# Altium footprint library Amirreza.PcbLib: 524 footprints (part 7 of 33)
Each footprint in its own frame and in the unit in brackets; x right, y up, seen from the top. Pads: shape width x height; smd on the part's side, far side on the other; paste and mask are expansions set on the pad; w line width, h text height; cw(c..) or ccw(c..) is an arc to the next point about the centre after c.
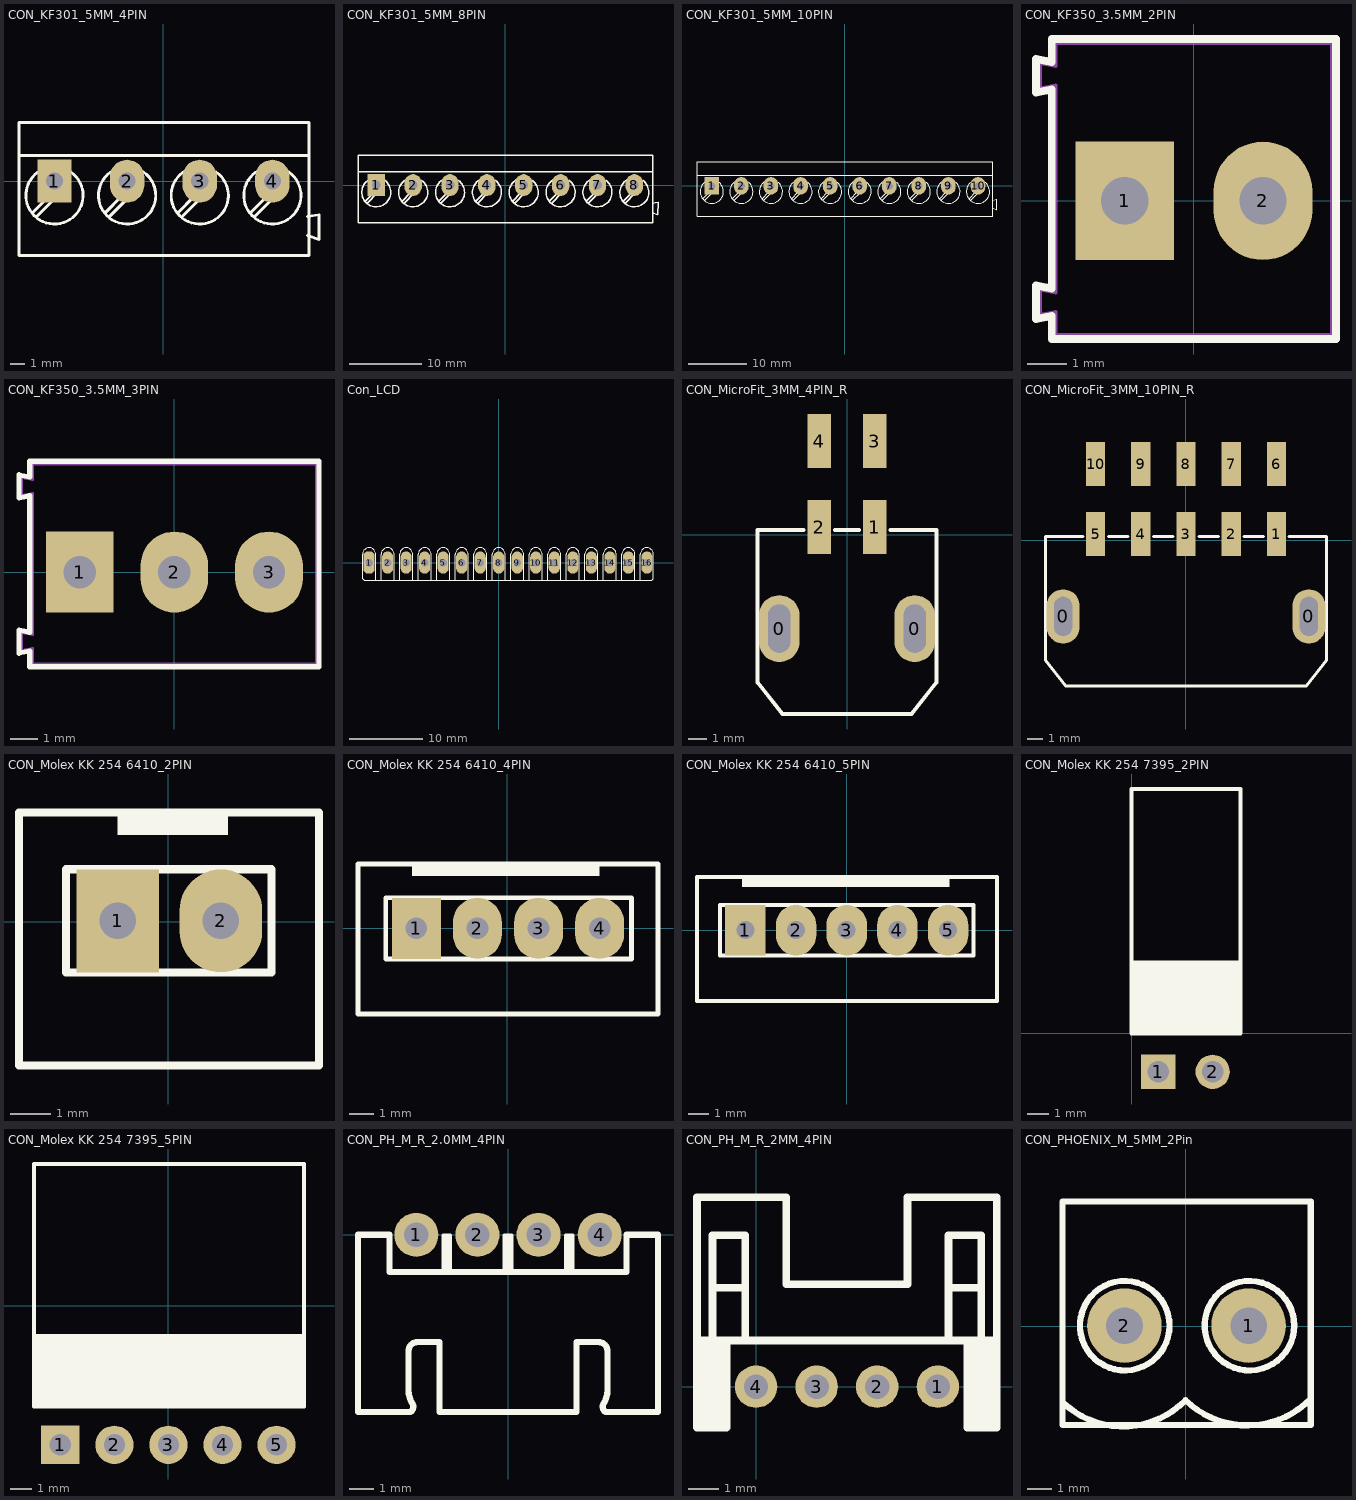
[diagram p6: the footprints below, top view; thin cyan lines are the x and y axes]

## CON_KF301_5MM_4PIN [mm] "Terminal Block Blue"
pads (4):
  rect 2.4x3 hole 1.2: 1(-7.62,0)
  oval 2.4x3 hole 1.2: 2(-2.54,0) 3(2.54,0) 4(7.62,0)
Top Overlay:
  lines w0.2: -10.1,1.8 10.18,1.8 ; -9.151,-2.209 -8.001,-1.059 ; -8.869,-2.491 -7.469,-1.091 ; -8.62,0.732 ccw(c-7.62,-1) -6.473,0.638 ; -4.071,-2.209 -2.921,-1.059 ; -3.789,-2.491 -2.389,-1.091 ; -3.54,0.732 ccw(c-2.54,-1) -1.393,0.638 ; 1.009,-2.209 2.159,-1.059 ; 1.291,-2.491 2.691,-1.091 ; 1.54,0.732 ccw(c2.54,-1) 3.687,0.638 ; 6.089,-2.209 7.239,-1.059 ; 6.371,-2.491 7.771,-1.091 ; 6.62,0.732 ccw(c7.62,-1) 8.767,0.638 ; 10.075,-2.484 10.88,-2.35 10.88,-4.075 10.084,-3.81 ; -10.1,-5.2 -10.1,4.1 10.18,4.1 10.18,-5.2 -10.1,-5.2
3D body "Socket Blue_4Pin.STEP": height 12.52, standoff -6.68, extent -10.031,-5.029 10.871,4.039

## CON_KF301_5MM_8PIN [mm] "Terminal Block Blue"
pads (8):
  rect 2.4x3 hole 1.2: 1(-17.78,0)
  oval 2.4x3 hole 1.2: 2(-12.7,0) 3(-7.62,0) 4(-2.54,0) 5(2.54,0) 6(7.62,0) 7(12.7,0) 8(17.78,0)
Top Overlay:
  lines w0.2: -20.3,1.8 20.34,1.8 ; -19.311,-2.209 -18.161,-1.059 ; -19.029,-2.491 -17.629,-1.091 ; -18.78,0.732 ccw(c-17.78,-1) -16.633,0.638 ; -14.231,-2.209 -13.081,-1.059 ; -13.949,-2.491 -12.549,-1.091 ; -13.7,0.732 ccw(c-12.7,-1) -11.553,0.638 ; -9.151,-2.209 -8.001,-1.059 ; -8.869,-2.491 -7.469,-1.091 ; -8.62,0.732 ccw(c-7.62,-1) -6.473,0.638 ; -4.071,-2.209 -2.921,-1.059 ; -3.789,-2.491 -2.389,-1.091 ; -3.54,0.732 ccw(c-2.54,-1) -1.393,0.638 ; 1.009,-2.209 2.159,-1.059 ; 1.291,-2.491 2.691,-1.091 ; 1.54,0.732 ccw(c2.54,-1) 3.687,0.638 ; 6.089,-2.209 7.239,-1.059 ; 6.371,-2.491 7.771,-1.091 ; 6.62,0.732 ccw(c7.62,-1) 8.767,0.638 ; 11.169,-2.209 12.319,-1.059 ; 11.451,-2.491 12.851,-1.091 ; 11.7,0.732 ccw(c12.7,-1) 13.847,0.638 ; 16.249,-2.209 17.399,-1.059 ; 16.531,-2.491 17.931,-1.091 ; 16.78,0.732 ccw(c17.78,-1) 18.927,0.638 ; 20.235,-2.484 21.04,-2.35 21.04,-4.075 20.244,-3.81 ; -20.3,-5.2 -20.3,4.1 20.34,4.1 20.34,-5.2 -20.3,-5.2
3D body "Socket Blue_8Pin.STEP": height 12.52, standoff -6.68, extent -20.216,-5.017 21.006,4.051

## CON_KF301_5MM_10PIN [mm] "Terminal Block Blue"
pads (10):
  rect 2.5x3 hole 1.2: 1(-22.86,0)
  oval 2.5x3 hole 1.2: 2(-17.78,0) 3(-12.7,0) 4(-7.62,0) 5(-2.54,0) 6(2.54,0) 7(7.62,0) 8(12.7,0) 9(17.78,0) 10(22.86,0)
Top Overlay:
  lines w0.2: -25.4,1.8 25.42,1.8 ; -24.391,-2.209 -23.241,-1.059 ; -24.109,-2.491 -22.709,-1.091 ; -23.86,0.732 ccw(c-22.86,-1) -21.713,0.638 ; -19.311,-2.209 -18.161,-1.059 ; -19.029,-2.491 -17.629,-1.091 ; -18.78,0.732 ccw(c-17.78,-1) -16.633,0.638 ; -14.231,-2.209 -13.081,-1.059 ; -13.949,-2.491 -12.549,-1.091 ; -13.7,0.732 ccw(c-12.7,-1) -11.553,0.638 ; -9.151,-2.209 -8.001,-1.059 ; -8.869,-2.491 -7.469,-1.091 ; -8.62,0.732 ccw(c-7.62,-1) -6.473,0.638 ; -4.071,-2.209 -2.921,-1.059 ; -3.789,-2.491 -2.389,-1.091 ; -3.54,0.732 ccw(c-2.54,-1) -1.393,0.638 ; 1.009,-2.209 2.159,-1.059 ; 1.291,-2.491 2.691,-1.091 ; 1.54,0.732 ccw(c2.54,-1) 3.687,0.638 ; 6.089,-2.209 7.239,-1.059 ; 6.371,-2.491 7.771,-1.091 ; 6.62,0.732 ccw(c7.62,-1) 8.767,0.638 ; 11.169,-2.209 12.319,-1.059 ; 11.451,-2.491 12.851,-1.091 ; 11.7,0.732 ccw(c12.7,-1) 13.847,0.638 ; 16.249,-2.209 17.399,-1.059 ; 16.531,-2.491 17.931,-1.091 ; 16.78,0.732 ccw(c17.78,-1) 18.927,0.638 ; 21.329,-2.209 22.479,-1.059 ; 21.611,-2.491 23.011,-1.091 ; 21.86,0.732 ccw(c22.86,-1) 24.007,0.638 ; 25.315,-2.484 26.12,-2.35 26.12,-4.075 25.324,-3.81 ; -25.4,-5.2 -25.4,4.1 25.42,4.1 25.42,-5.2 -25.4,-5.2
3D body "Socket Blue_10Pin.STEP": height 12.52, standoff -6.68, extent -25.298,-4.991 26.086,4.077

## CON_KF350_3.5MM_2PIN [mm]
pads (2):
  rect 2.5x3 hole 1.2: 1(-1.75,0)
  oval 2.5x3 hole 1.2: 2(1.75,0)
Top Overlay:
  lines w0.2: -4,-2.995 -3.6,-2.92 -3.6,-3.5 3.6,-3.5 3.6,4.1 -3.6,4.1 -3.6,3.52 -4,3.595 -4,2.745 -3.6,2.82 -3.6,-2.22 -4,-2.145 -4,-2.995
Mechanical 13:
  lines w0.1: -3.9,-2.895 -3.9,-2.245 -3.5,-2.32 -3.5,2.92 -3.9,2.845 -3.9,3.495 -3.5,3.42 -3.5,4 3.5,4 3.5,-3.4 -3.5,-3.4 -3.5,-2.82 -3.9,-2.895
3D body "691214110002.stp": height 8.55, standoff -3.65, extent -4.001,-3.37 3.449,4.03

## CON_KF350_3.5MM_3PIN [mm]
pads (3):
  rect 2.5x3 hole 1.2: 1(-3.5,0)
  oval 2.5x3 hole 1.2: 2(0,0) 3(3.5,0)
Top Overlay:
  lines w0.2: -5.75,-2.995 -5.35,-2.92 -5.35,-3.5 5.35,-3.5 5.35,4.1 -5.35,4.1 -5.35,3.52 -5.75,3.595 -5.75,2.745 -5.35,2.82 -5.35,-2.22 -5.75,-2.145 -5.75,-2.995
Mechanical 13:
  lines w0.1: -5.65,-2.895 -5.65,-2.245 -5.25,-2.32 -5.25,2.92 -5.65,2.845 -5.65,3.495 -5.25,3.42 -5.25,4 5.25,4 5.25,-3.4 -5.25,-3.4 -5.25,-2.82 -5.65,-2.895
3D body "691214110003.stp": height 8.55, standoff -3.65, extent -5.751,-3.395 5.199,4.005

## Con_LCD [mil]
pads (16):
  oct 60x120 hole 40: 1(-700,0)
  oval 60x120 hole 40: 2(-600,0) 3(-500,0) 4(-400,0) 5(-300,0) 6(-200,0) 7(-100,0) 8(0,0) 9(100,0) 10(200,0) 11(300,0) 12(400,0) 13(500,0) 14(600,0) 15(700,0) 16(800,0)
Top Overlay:
  lines w5: -735,-87.36 -735,45 cw(c-700,45) -665,45 -665,-95 ; -635,-95 -635,45 cw(c-600,45) -565,45 -565,-95 ; -535,-95 -535,45 cw(c-500,45) -465,45 -465,-95 ; -435,-95 -435,45 cw(c-400,45) -365,45 -365,-95 ; -335,-95 -335,45 cw(c-300,45) -265,45 -265,-95 ; -235,-95 -235,45 cw(c-200,45) -165,45 -165,-95 ; -135,-95 -135,45 cw(c-100,45) -65,45 -65,-95 ; -35,-95 -35,45 cw(c0,45) 35,45 35,-95 ; 65,-95 65,45 cw(c100,45) 135,45 135,-95 ; 165,-95 165,45 cw(c200,45) 235,45 235,-95 ; 265,-95 265,45 cw(c300,45) 335,45 335,-95 ; 365,-95 365,45 cw(c400,45) 435,45 435,-95 ; 465,-95 465,45 cw(c500,45) 535,45 535,-95 ; 565,-95 565,45 cw(c600,45) 635,45 635,-95 ; 665,-95 665,45 cw(c700,45) 735,45 735,-95 ; 765,-95 765,45 cw(c800,45) 835,45 835,-86.77
  lines w5.91: -735,-87.36 -727.36,-95 826.77,-95 835,-86.77

## CON_MicroFit_3MM_4PIN_R [mm]
pads (6):
  oval 2.2x3.6 hole 1.2 slot 2.6 at 90 deg: 0(-3.65,-5.05) 0(3.65,-5.05)
  rect 1.27x2.92 smd: 1(1.5,0.42) 2(-1.5,0.42) 3(1.5,5.05) 4(-1.5,5.05)
Top Overlay:
  lines w0.203: -2.35,0.26 -4.825,0.26 -4.825,-7.948 -3.48,-9.65 3.48,-9.65 4.825,-7.948 4.825,0.26 2.35,0.26 ; -0.65,0.26 0.65,0.26
3D body "430450406.stp": height 8.76, standoff -2.01, extent -5.075,-9.655 5.075,5.745

## CON_MicroFit_3MM_10PIN_R [mm]
pads (12):
  oval 2.2x3.6 hole 1.2 slot 2.6 at 90 deg: 0(-8.15,-5.05) 0(8.15,-5.05)
  rect 1.27x2.92 smd: 1(6,0.42) 2(3,0.42) 3(0,0.42) 4(-3,0.42) 5(-6,0.42) 6(6,5.05) 7(3,5.05) 8(0,5.05) 9(-3,5.05) 10(-6,5.05)
Top Overlay:
  lines w0.203: -6.85,0.26 -9.325,0.26 -9.325,-7.948 -7.98,-9.65 7.98,-9.65 9.325,-7.948 ; -5.15,0.26 -3.85,0.26 ; -2.15,0.26 -0.85,0.26 ; 0.85,0.26 2.15,0.26 ; 3.85,0.26 5.15,0.26 ; 6.85,0.26 9.325,0.26 9.325,-7.948
3D body "430451006.stp": height 8.76, standoff -2.01, extent -9.575,-9.655 9.575,5.745

## CON_Molex KK 254 6410_2PIN [mil] "Molex KK 254 6410, 2 Way, 1 Row, Vertical PCB Header"
pads (2):
  rect 80x100 hole 35.43: 1(-49,1)
  oval 80x100 hole 35.43: 2(51,1)
Top Overlay:
  rectangle: -49,84 57.89,103.05
  lines w7.87: -144.48,-139 146,-139 146,106 -144.48,106 -144.48,-139 ; -99,-49 -99,51 100,51 100,-49 -99,-49
3D body "User Library-molex kk 0_1in latching 2 way vertical header.step": height 462.46, standoff -137.54, extent -99.21,-116.99 100.79,113.01

## CON_Molex KK 254 6410_4PIN [mil] "Molex KK 254 6410, 4 Way, 1 Row, Straight PCB Header"
pads (4):
  rect 80x100 hole 35.43: 1(-149,0)
  oval 80x100 hole 35.43: 2(-49,0) 3(51,0) 4(151,0)
Top Overlay:
  rectangle: -155.89,86 151,103.05
  lines w7.87: -244.48,-140 -244.48,105 246.5,105 246.5,-140 -244.48,-140 ; -199,-50 203,-50 203,50 -199,50 -199,-50
3D body "User Library-WF-4.step": height 463.73, standoff -98.43, extent -200,-125.98 200,106.3

## CON_Molex KK 254 6410_5PIN [mm] "Molex KK 254 6410, 5 Way, 1 Row, Straight PCB Header"
pads (5):
  rect 2.032x2.54 hole 0.9: 1(-5.08,0)
  oval 2.032x2.54 hole 0.9: 2(-2.54,0) 3(0,0) 4(2.54,0) 5(5.08,0)
Top Overlay:
  rectangle: -5.255,2.168 5.145,2.643
  lines w0.2: -7.505,-3.556 7.535,-3.556 7.535,2.667 -7.505,2.667 -7.505,-3.556 ; -6.35,-1.27 -6.35,1.27 6.35,1.27 6.35,-1.27 -6.35,-1.27
3D body "User Library-WF-5.step": height 11.69, standoff -2.71, extent -6.35,-3.2 6.35,2.6

## CON_Molex KK 254 7395_2PIN [mm] "Molex KK 254 7395, 2 Way, 1 Row, Right Angle PCB Header"
pads (2):
  rect 1.6x1.6 / inner rect 1.6x1.6 / far side rect 2x2 hole 1: 1(1.245,-1.8)
  round 1.6 / inner round 1.6 / far side round 2 hole 1: 2(3.785,-1.8)
Top Overlay:
  rectangle: 0,0 5.08,3.3
  lines w0.2: 0,3.3 5.08,3.3 ; 0,0 0,11.4 5.08,11.4 5.08,0 0,0
3D body "22-05-7028.step": height 5.87, standoff -3.77, extent -0.025,-2.136 5.055,12.602

## CON_Molex KK 254 7395_5PIN [mm] "Molex KK 254 7395, 5 Way, 1 Row, Right Angle PCB Header"
pads (5):
  rect 1.8x1.8 / inner rect 1.8x1.8 / far side rect 2.1x2.1 hole 1: 1(-5.068,-6.532)
  round 1.8 / inner round 1.8 / far side round 2.1 hole 1: 2(-2.528,-6.532) 3(0.012,-6.532) 4(2.552,-6.532) 5(5.092,-6.532)
Top Overlay:
  rectangle: -6.313,-4.732 6.387,-1.446
  lines w0.2: -6.313,-1.432 6.387,-1.432 ; -6.313,-4.732 6.387,-4.732 6.387,6.668 -6.313,6.668 -6.313,-4.732
3D body "22-05-7058.step": height 5.87, standoff -3.77, extent -6.338,-6.868 6.362,7.87

## CON_PH_M_R_2.0MM_4PIN [mm]
pads (4):
  round 1.8 / inner round 1.8 / far side rect 1.8x2.5 hole 1: 1(-3.75,0)
  round 1.8 / inner round 1.8 / far side rrect50% 1.8x2.5 hole 1: 2(-1.25,0) 3(1.25,0) 4(3.75,0)
Top Overlay:
  rectangle: 2.348,-1.524 2.652,0
  rectangle: -0.152,-1.524 0.152,0
  rectangle: -2.652,-1.524 -2.348,0
  lines w0.127: -2.652,-1.524 -2.652,0 -2.348,0 -2.348,-1.524 ; -0.152,-1.524 -0.152,0 0.152,0 0.152,-1.524 ; 2.348,-1.524 2.348,0 2.652,0 2.652,-1.524
  lines w0.254: -2.348,-1.524 0.152,-1.524 2.652,-1.524 4.848,-1.524 4.848,0.003 6.137,0.003 6.137,-7.251 ; -2.348,-1.524 -4.848,-1.524 -4.848,0.003 -6.137,0.003 -6.137,-7.251 -6.137,-7.254 -4,-7.254 ccw(c-4.127,-7.034) -3.932,-6.871 cw(c-3.053,-6.363) -4.069,-6.363 -4.069,-4.755 cw(c-3.703,-4.755) -3.703,-4.389 -2.8,-4.389 -2.8,-7.254 2.8,-7.254 2.8,-4.389 3.703,-4.389 cw(c3.703,-4.755) 4.069,-4.755 4.069,-6.363 cw(c3.053,-6.363) 3.932,-6.871 ccw(c4.127,-7.034) 4,-7.254 6.137,-7.254
3D body "User Library-JST-XH-2_5mm-4.step": height 5.97, standoff -3.33, extent -6.248,-7.254 6.252,0.386

## CON_PH_M_R_2MM_4PIN [mm] "S4B-PH-K-S / LDZY"
pads (4):
  round 1.4 / inner round 1.4 / far side round 1.6 hole 0.8: 1(6,0) 2(4,0) 3(2,0) 4(0,0)
Top Overlay:
  rectangle: 6.973,-1.346 7.954,1.524
  rectangle: -1.95,-1.45 -0.973,1.524
  lines w0.254: -1.95,1.524 7.95,1.524 ; -1.435,1.524 -1.435,5.004 -0.352,5.004 -0.352,1.524 ; -1.435,3.264 -0.352,3.264 ; -0.973,1.524 -0.973,-1.346 -1.95,-1.346 -1.95,6.25 1,6.25 1,3.385 5,3.385 5,6.25 7.95,6.25 7.95,-1.346 6.973,-1.346 6.973,1.524 ; 6.352,1.524 6.352,5.004 7.435,5.004 7.435,1.524 ; 6.352,3.264 7.435,3.264
3D body "S4B-PH-K-S(LF)(SN)--3DModel-STEP-56544.STEP": height 4.8, standoff -3.38, extent -1.946,-1.346 7.954,6.254

## CON_PHOENIX_M_5MM_2Pin [mil]
pads (2):
  round 120 hole 59.06: 1(101.52,1) 2(-98.48,1)
Top Overlay:
  circle w10: c102.76,1 r72.11
  circle w10: c-98.02,1 r72.11
  lines w10: -198.48,-121.72 ccw(c-100.69,-21.2) -0.17,-119 ccw(c99.53,-17.01) 201.52,-116.72 ; -198.48,-159 201.52,-159 201.52,201 -198.48,201 -198.48,-159
3D body "1753437.stp": height 474.41, standoff -151.57, extent -194.85,-149 198.85,189.58